# Altium schematic symbol library LATTICEPLDS_Library.SchLib: 291 symbols (part 11 of 32) (continued)
## LFE2M-100-F1152 (continued)
part B pins: A14 PT39A, A15 PT49B, A16 PT55A, A17 PT57A, B14 PT39B, B15 PT49A, B16 PT55B, B17 PT57B, C12 VCCIO0 (power), C14 PT37A, C15 PT41B, C16 VCCIO0 (power), C17 PT52A, D11 PT30A, D12 PT32A, D13 PT37B, D14 PT41A, D17 PT56B, E11 PT29A, E12 PT31A, E13 PT32B, E14 VCCIO0 (power), E15 PT46B, E16 PT47A, E17 PT52B, F11 PT29B, F12 PT30B, F13 PT38B, F15 PT42B, F16 PT47B, F17 PT56A, F18 PT64B, G12 PT31B, G13 PT40B, G14 PT42A, G15 PT46A, G16 PT50B, G17 PT59B, G19 PT64A, H12 VCCIO0 (power), H13 PT38A, H14 PT44B, H15 PT50A, H16 VCCIO0 (power), H17 PT58B, H18 PT63B, J13 PT40A, J14 PT45B, J15 PT51A, J17 PT59A, J18 PT60B, K14 PT44A, K15 PT48A, K16 PT51B, K17 PT58A, K18 PT63A, L15 PT45A, L16 PT48B, L17 PT60A, M14 VCCIO0 (power), M15 VCCIO0 (power)
part C pins: A18 PT66B, A19 PT72B, A20 PT75B, A21 PT86A, B18 PT66A, B19 PT72A, B20 PT75A, B21 PT86B, C18 PT69A, C19 VCCIO1 (power), C20 PT77B, C21 PT88B, C23 VCCIO1 (power), D18 PT68A, D20 PT78B, D21 PT88A, D22 PT98A, D23 PT98B, E18 PT65A, E19 PT69B, E20 PT77A, E21 VCCIO1 (power), E22 PT85A, E23 PT100B, F19 PT68B, F20 PT78A, F22 PT85B, F23 PT100A, F24 PT99B, G18 PT65B, G20 PT76B, G21 PT80B, G22 PT84A, G23 PT99A, H19 VCCIO1 (power), H20 PT71A, H21 PT79B, H22 PT81B, H23 VCCIO1 (power), H30 XRES, J20 PT76A, J21 PT80A, J22 PT84B, K19 PT67A, K20 PT71B, K21 PT79A, K22 PT81A, L18 PT67B, L19 PT70B, L20 PT70A, M20 VCCIO1 (power), M21 VCCIO1 (power)
part D pins: G32 VCCIO2 (power), H31 PR9B, H32 PR9A, H33 PR14B, H34 PR14A, J27 PR11B, J28 PR11A, J29 PR13A, J30 PR13B, J31 PR15A, J32 PR15B, J33 PR16A, J34 PR16B, K28 VCCIO2 (power), K29 PR17A, K30 PR17B, K32 VCCIO2 (power), K33 PR18A, K34 PR18B, L27 PR29B, L28 PR20B, L29 PR20A, L30 PR19A, L31 PR21A, L32 PR21B, L33 PR22A, L34 PR22B, M26 PR29A, M27 PR30A, M28 PR30B, M29 PR33A, M30 PR19B, M31 PR28A, M32 PR28B, M33 PR35A, M34 PR35B, N24 PR31B, N25 PR31A, N27 VCCIO2 (power), N28 PR32B, N29 PR32A, N30 PR33B, N32 VCCIO2 (power), N33 PR37A, N34 PR37B, P23 VCCIO2 (power), P24 PR34A, P27 PR41A, P28 PR41B, P29 PR40A, P30 PR40B, P31 PR39B, P32 PR39A, P33 PR43A, P34 PR43B, R23 VCCIO2 (power), R24 PR34B, R25 PR38B, R26 PR42B, R27 PR47B, R28 PR47A, R29 PR46B, R30 PR46A, R31 PR44A, R32 PR44B, R33 PR45B, R34 PR45A, T24 PR38A, T25 PR42A, T27 VCCIO2 (power), T28 PR51A, T29 PR51B, T30 PR52B, T32 VCCIO2 (power), T33 PR48B, T34 PR48A, U24 PR56B, U25 PR56A, U28 PR54B, U29 PR54A, U30 PR52A, U31 PR50B, U32 PR50A, U33 PR53B, U34 PR53A, V30 PR55B, V33 PR57B, V34 PR57A, Y32 PR55A
part E pins: AA23 VCCIO3 (power), AA24 PR71B, AA25 PR82B, AA26 PR87A, AA27 PR84A, AA28 PR74B, AA29 PR74A, AA30 PR73B, AA31 PR75B, AA32 PR75A, AA33 PR77A, AA34 PR77B, AB24 PR80B, AB25 PR88B, AB27 VCCIO3 (power), AB28 PR87B, AB29 PR78A, AB30 PR73A, AB32 VCCIO3 (power), AB33 PR79B, AB34 PR79A, AC24 PR82A, AC25 PR88A, AC27 PR92B, AC28 PR92A, AC29 PR84B, AC31 PR83A, AC32 PR83B, AC33 PR81B, AC34 PR81A, AD26 PR102A, AD29 PR91B, AD30 PR91A, AD31 PR89A, AD32 PR89B, AD33 PR86B, AD34 PR86A, AE28 VCCIO3 (power), AE29 PR95B, AE30 PR95A, AE32 VCCIO3 (power), AE33 PR90B, AE34 PR90A, AF27 RLM0_PLLCAP, AF28 PR102B, AF29 PR98B, AF30 PR96B, AF31 PR98A, AF32 PR96A, AF33 PR93B, AF34 PR93A, AG33 PR97B, AG34 PR97A, AH32 VCCIO3 (power), AH33 PR99B, AH34 PR99A, AJ32 PR101B, AJ33 PR101A, AJ34 PR100B, AK34 PR100A, U26 PR62A, U27 PR60B, V24 PR62B, V25 PR64B, V26 PR66A, V27 PR65A, V28 PR65B, V29 PR60A, V31 PR59B, V32 PR59A, W24 PR64A, W25 PR69A, W27 VCCIO3 (power), W28 PR66B, W29 PR61B, W30 PR61A, W32 VCCIO3 (power), W33 PR63B, W34 PR63A, Y23 VCCIO3 (power), Y24 PR69B, Y25 PR71A, Y26 PR80A, Y27 PR78B, Y28 PR72B, Y29 PR72A, Y30 PR70A, Y31 PR70B, Y33 PR68B, Y34 PR68A
part F pins: AC20 VCCIO4 (power), AC21 VCCIO4 (power), AD18 PB67B, AD20 PB80A, AE18 PB71B, AE20 PB82A, AF18 PB67A, AF20 PB80B, AG18 PB71A, AG19 VCCIO4 (power), AG20 PB82B, AG21 PB90B, AG22 PB90A, AG23 VCCIO4 (power), AH18 PB72B, AH19 PB78A, AH20 PB81B, AH21 PB89B, AH22 PB89A, AH23 PB99B, AJ18 PB72A, AJ19 PB81A, AJ20 PB78B, AJ22 PB97B, AJ23 PB99A, AK18 PB73A, AK19 PB73B, AK20 PB75B, AK21 VCCIO4 (power), AK22 PB97A, AK23 PB98B, AL20 PB75A, AL21 PB76B, AL22 PB92B, AL23 PB98A, AL24 PB96B, AM19 VCCIO4 (power), AM20 PB69B, AM21 PB70B, AM22 PB92A, AM24 PB96A, AN19 PB68B, AN20 PB70A, AN21 PB74B, AN22 PB76A, AN23 PB95B, AP19 PB68A, AP20 PB69A, AP21 PB74A, AP23 PB95A
part G pins: AC14 VCCIO5 (power), AC15 VCCIO5 (power), AD16 PB53B, AD17 PB58A, AE14 PB38A, AE15 PB45A, AE16 PB51B, AE17 PB58B, AF13 PB44B, AF14 PB44A, AF15 PB53A, AF17 PB62A, AG12 VCCIO5 (power), AG13 PB38B, AG14 PB45B, AG15 PB51A, AG16 VCCIO5 (power), AG17 PB61A, AH12 PB32B, AH14 PB40A, AH15 PB46A, AH16 PB54B, AH17 PB62B, AJ12 PB32A, AJ15 PB40B, AJ16 PB48B, AJ17 PB61B, AK13 PB36B, AK14 VCCIO5 (power), AK15 PB46B, AK16 PB48A, AK17 PB54A, AL13 PB36A, AL14 PB42A, AL15 PB47A, AL17 PB56A, AL18 PB59A, AM12 VCCIO5 (power), AM14 PB42B, AM15 PB47B, AM16 VCCIO5 (power), AM17 PB56B, AM18 PB59B, AM23 VCCIO4 (power), AN14 PB39A, AN15 PB49A, AN16 PB55A, AN17 PB57A, AN18 PB60B, AP14 PB39B, AP15 PB49B, AP16 PB55B, AP17 PB57B, AP18 PB60A
part H pins: AA1 PL72A, AA2 PL72B, AA3 PL75B, AA4 PL75A, AA5 PL78A, AA6 PL74A, AA7 PL74B, AA8 PL73A, AA9 PL77A, AA10 PL77B, AA12 VCCIO6 (power), AB1 PL79A, AB2 PL79B, AB3 VCCIO6 (power), AB5 PL82B, AB6 PL78B, AB7 PL82A, AB8 VCCIO6 (power), AB10 PL80B, AC1 PL81A, AC2 PL81B, AC3 PL83A, AC4 PL83B, AC5 PL86B, AC6 PL87A, AC7 PL86A, AC8 PL80A, AC9 PL84B, AC10 PL84A, AC11 PL91B, AD1 PL90B, AD2 PL90A, AD3 PL88B, AD4 PL88A, AD5 PL87B, AD6 PL92A, AD7 PL92B, AD8 PL89B, AD9 PL91A, AD10 PL89A, AE1 PL93A, AE2 PL93B, AE3 VCCIO6 (power), AE5 PL96A, AE6 PL96B, AE7 VCCIO6 (power), AE9 PL100A, AF1 PL95B, AF2 PL95A, AF3 PL97B, AF4 PL97A, AF5 PL98A, AF6 PL98B, AF7 PL100B, AG1 PL99A, AG2 PL99B, AG4 PL102B, AG5 PL102A, AG6 LLM0_PLLCAP, AH1 PL101A, AH2 PL101B, AH3 VCCIO6 (power), AJ1 PL104A, AJ2 PL104B, U1 PL59B, U2 PL59A, V1 PL63B, V2 PL63A, V3 PL62B, V4 PL62A, V5 PL60A, V6 PL60B, V7 PL61A, V8 PL61B, W1 PL65B, W2 PL65A, W3 VCCIO6 (power), W5 PL64B, W6 PL66B, W7 PL64A, W8 VCCIO6 (power), W10 PL70A, Y1 PL68A, Y2 PL68B, Y3 PL71B, Y4 PL71A, Y5 PL69B, Y6 PL66A, Y7 PL69A, Y8 PL70B, Y9 PL73B, Y12 VCCIO6 (power)
part I pins: E1 PL11A, E2 PL11B, F1 PL13A, F2 PL13B, F3 PL9B, F4 PL9A, G1 PL15B, G2 PL15A, G3 VCCIO7 (power), G5 PL20A, G6 PL20B, H1 PL19B, H2 PL19A, H3 PL22A, H4 PL22B, H5 PL18A, H6 PL14B, H7 PL12B, J1 PL23B, J2 PL23A, J3 PL25B, J4 PL25A, J5 PL26A, J6 PL18B, J7 PL16A, J8 PL14A, K1 PL24B, K2 PL24A, K3 VCCIO7 (power), K5 PL26B, K6 PL29B, K7 VCCIO7 (power), K9 PL12A, L1 PL28B, L2 PL28A, L3 PL32A, L4 PL32B, L5 PL31B, L6 PL31A, L7 PL29A, L8 PL16B, L9 PL17A, L10 PL17B, M1 PL30B, M2 PL30A, M3 PL33A, M4 PL33B, M5 PL35A, M7 PL38B, M9 PL21A, M10 PL21B, N1 PL34A, N2 PL34B, N3 VCCIO7 (power), N5 PL41B, N6 PL35B, N7 PL40A, N8 VCCIO7 (power), P1 PL39A, P2 PL39B, P3 PL37A, P4 PL37B, P5 PL41A, P6 PL42B, P7 PL40B, P8 PL42A, P9 PL38A, P11 PL44B, P12 VCCIO7 (power), R1 PL47A, R2 PL47B, R3 PL43A, R4 PL43B, R5 PL46A, R6 PL52B, R7 PL45A, R8 PL45B, R10 PL44A, R11 PL48A, R12 VCCIO7 (power), T1 PL50A, T2 PL50B, T3 VCCIO7 (power), T5 PL46B, T6 PL52A, T7 PL53B, T8 VCCIO7 (power), T10 PL48B, U3 PL57B, U4 PL57A, U5 PL54A, U6 PL54B, U7 PL55A, U8 PL51B, U9 PL53A, U10 PL51A, V9 PL55B, V10 PL56B, V11 PL56A
part J pins: AD24 CFG1, AD25 CSN, AD28 VCCIO8 (power), AE24 WRITEN, AE25 INITN, AE26 D6, AF25 PROGRAMN, AF26 D4, AG27 DI, AG28 D1, AG29 D0, AG30 D2, AG32 VCCIO8 (power), AH28 CFG2, AH29 D3, AH30 D5, AJ28 CCLK, AJ29 CFG0, AJ30 CS1N, AJ31 D7, AK31 DONE, AK32 DOUT_CSON, AK33 BUSY
part K pins: AF10 TDO, AK1 TDI, AK2 TCK, AK3 VCCJ, AL1 TMS
part L pins: A2 ULC_SQ_HDOUTP3, A3 ULC_SQ_HDOUTN3, A4 ULC_SQ_HDOUTN2, A5 ULC_SQ_HDOUTP2, A6 ULC_SQ_HDOUTP1, A7 ULC_SQ_HDOUTN1, A8 ULC_SQ_HDOUTN0, A9 ULC_SQ_HDOUTP0, B1 ULC_SQ_VCCIB3, B2 ULC_SQ_VCCRX3, B3 ULC_SQ_VCCTX3, B4 ULC_SQ_VCCTX2, B5 ULC_SQ_VCCRX2, B6 ULC_SQ_VCCRX1, B7 ULC_SQ_VCCTX1, B8 ULC_SQ_VCCTX0, B9 ULC_SQ_VCCIB0, C1 ULC_SQ_VCCOB3, C2 ULC_SQ_HDINP3, C3 ULC_SQ_HDINN3, C4 ULC_SQ_HDINN2, C5 ULC_SQ_HDINP2, C6 ULC_SQ_HDINP1, C7 ULC_SQ_HDINN1, C8 ULC_SQ_HDINN0, C9 ULC_SQ_HDINP0, D3 ULC_SQ_VCCOB2, D4 ULC_SQ_VCCIB2, D5 ULC_SQ_REFCLKP, D6 ULC_SQ_VCCP, D7 ULC_SQ_VCCRX0, D8 ULC_SQ_VCCIB1, D9 ULC_SQ_VCCOB0, E5 ULC_SQ_REFCLKN, E6 ULC_SQ_VCCAUX33, E7 ULC_SQ_VCCOB1
part M pins: A26 URC_SQ_HDOUTP3, A27 URC_SQ_HDOUTN3, A28 URC_SQ_HDOUTN2, A29 URC_SQ_HDOUTP2, A30 URC_SQ_HDOUTP1, A31 URC_SQ_HDOUTN1, A32 URC_SQ_HDOUTN0, A33 URC_SQ_HDOUTP0, B26 URC_SQ_VCCIB3, B27 URC_SQ_VCCTX3, B28 URC_SQ_VCCTX2, B29 URC_SQ_VCCRX2, B30 URC_SQ_VCCRX1, B31 URC_SQ_VCCTX1, B32 URC_SQ_VCCTX0, B33 URC_SQ_VCCRX0, B34 URC_SQ_VCCIB0, C26 URC_SQ_HDINP3, C27 URC_SQ_HDINN3, C28 URC_SQ_HDINN2, C29 URC_SQ_HDINP2, C30 URC_SQ_HDINP1, C31 URC_SQ_HDINN1, C32 URC_SQ_HDINN0, C33 URC_SQ_HDINP0, C34 URC_SQ_VCCOB0, D26 URC_SQ_VCCOB3, D27 URC_SQ_VCCIB2, D28 URC_SQ_VCCRX3, D29 URC_SQ_VCCP, D30 URC_SQ_REFCLKP, D31 URC_SQ_VCCIB1, D32 URC_SQ_VCCOB1, E28 URC_SQ_VCCOB2, E29 URC_SQ_VCCAUX33, E30 URC_SQ_REFCLKN
part N pins: AK28 LRC_SQ_VCCOB2, AK29 LRC_SQ_VCCAUX33, AK30 LRC_SQ_REFCLKN, AL26 LRC_SQ_VCCOB3, AL27 LRC_SQ_VCCIB2, AL28 LRC_SQ_VCCRX3, AL29 LRC_SQ_VCCP, AL30 LRC_SQ_REFCLKP, AL31 LRC_SQ_VCCIB1, AL32 LRC_SQ_VCCOB1, AM26 LRC_SQ_HDINP3, AM27 LRC_SQ_HDINN3, AM28 LRC_SQ_HDINN2, AM29 LRC_SQ_HDINP2, AM30 LRC_SQ_HDINP1, AM31 LRC_SQ_HDINN1, AM32 LRC_SQ_HDINN0, AM33 LRC_SQ_HDINP0, AM34 LRC_SQ_VCCOB0, AN26 LRC_SQ_VCCIB3, AN27 LRC_SQ_VCCTX3, AN28 LRC_SQ_VCCTX2, AN29 LRC_SQ_VCCRX2, AN30 LRC_SQ_VCCRX1, AN31 LRC_SQ_VCCTX1, AN32 LRC_SQ_VCCTX0, AN33 LRC_SQ_VCCRX0, AN34 LRC_SQ_VCCIB0, AP26 LRC_SQ_HDOUTP3, AP27 LRC_SQ_HDOUTN3, AP28 LRC_SQ_HDOUTN2, AP29 LRC_SQ_HDOUTP2, AP30 LRC_SQ_HDOUTP1, AP31 LRC_SQ_HDOUTN1, AP32 LRC_SQ_HDOUTN0, AP33 LRC_SQ_HDOUTP0
part O pins: AK5 LLC_SQ_REFCLKN, AK6 LLC_SQ_VCCAUX33, AK7 LLC_SQ_VCCOB1, AL3 LLC_SQ_VCCOB2, AL4 LLC_SQ_VCCIB2, AL5 LLC_SQ_REFCLKP, AL6 LLC_SQ_VCCP, AL7 LLC_SQ_VCCRX0, AL8 LLC_SQ_VCCIB1, AL9 LLC_SQ_VCCOB0, AM1 LLC_SQ_VCCOB3, AM2 LLC_SQ_HDINP3, AM3 LLC_SQ_HDINN3, AM4 LLC_SQ_HDINN2, AM5 LLC_SQ_HDINP2, AM6 LLC_SQ_HDINP1, AM7 LLC_SQ_HDINN1, AM8 LLC_SQ_HDINN0, AM9 LLC_SQ_HDINP0, AN1 LLC_SQ_VCCIB3, AN2 LLC_SQ_VCCRX3, AN3 LLC_SQ_VCCTX3, AN4 LLC_SQ_VCCTX2, AN5 LLC_SQ_VCCRX2, AN6 LLC_SQ_VCCRX1, AN7 LLC_SQ_VCCTX1, AN8 LLC_SQ_VCCTX0, AN9 LLC_SQ_VCCIB0, AP2 LLC_SQ_HDOUTP3, AP3 LLC_SQ_HDOUTN3, AP4 LLC_SQ_HDOUTN2, AP5 LLC_SQ_HDOUTP2, AP6 LLC_SQ_HDOUTP1, AP7 LLC_SQ_HDOUTN1, AP8 LLC_SQ_HDOUTN0, AP9 LLC_SQ_HDOUTP0
part P pins: A11 NC, A12 NC, A23 NC, A24 NC, AA11 NC, AB11 NC, AC26 NC, AC30 NC, AD11 NC, AD12 NC, AD13 NC, AD14 NC, AD15 NC, AD19 NC, AD21 NC, AD22 NC, AD23 NC, AE10 NC, AE11 NC, AE12 NC, AE13 NC, AE19 NC, AE21 NC, AE22 NC, AE23 NC, AF8 NC, AF9 NC, AF11 NC, AF21 NC, AF22 NC, AF24 NC, AG3 NC, AG7 NC, AG8 NC, AG9 NC, AG10 NC, AG11 NC, AG24 NC, AG25 NC, AG26 NC, AH5 NC, AH6 NC, AH7 NC, AH8 NC, AH9 NC, AH10 NC, AH11 NC, AH13 NC, AH24 NC, AH25 NC, AH26 NC, AH27 NC, AJ3 NC, AJ4 NC, AJ5 NC, AJ6 NC, AJ7 NC, AJ8 NC, AJ9 NC, AJ10 NC, AJ11 NC, AJ13 NC, AJ24 NC, AJ25 NC, AJ26 NC, AJ27 NC, AK4 NC, AK9 NC, AK10 NC, AK11 NC, AK12 NC, AK24 NC, AK25 NC, AK26 NC, AL11 NC, AL12 NC, AL34 NC, AM10 NC, AM11 NC, AM13 NC, AM25 NC, AN10 NC, AN11 NC, AN12 NC, AN13 NC, AN24 NC, AN25 NC, AP11 NC, AP12 NC, AP24 NC, B10 NC, B11 NC, B12 NC, B13 NC, B22 NC, B23 NC, B24 NC, B25 NC, C10 NC, C11 NC, C13 NC, C22 NC, C24 NC, C25 NC, D1 NC, D15 NC, D24 NC, D34 NC, E3 NC, E4 NC, E9 NC, E10 NC, E24 NC, E25 NC, E26 NC, E31 NC, E32 NC, E33 NC, E34 NC, F5 NC, F6 NC, F7 NC, F8 NC, F9 NC, F10 NC, F25 NC, F26 NC, F27 NC, F28 NC, F29 NC, F30 NC, F31 NC, F32 NC, F33 NC, F34 NC, G7 NC, G8 NC, G9 NC, G10 NC, G11 NC, G24 NC, G25 NC, G26 NC, G27 NC, G28 NC, G29 NC, G30 NC, G33 NC, G34 NC, H8 NC, H9 NC, H10 NC, H11 NC, H24 NC, H25 NC, H26 NC, H27 NC, H28 NC, H29 NC, J9 NC, J10 NC, J11 NC, J24 NC, J25 NC, J26 NC, K10 NC, K11 NC, K12 NC, K13 NC, K23 NC, K24 NC, K25 NC, K26 NC, L11 NC, L12 NC, L13 NC, L14 NC, L21 NC, L22 NC, L23 NC, L24 NC, L25 NC, L26 NC, M6 NC, M8 NC, M11 NC, M24 NC, M25 NC, N10 NC, N11 NC, P10 NC, P25 NC, P26 NC, R9 NC, T11 NC, U11 NC, W11 NC, Y10 NC, Y11 NC
part A text: SUPPLIES
part B text: BANK 0
part C text: BANK 1
part D text: BANK 2
part E text: BANK 3
part F text: BANK 4
part G text: BANK 5
part H text: BANK 6
part I text: BANK 7
part J text: BANK 8
part L text: SERDES
part M text: SERDES
part N text: SERDES
part O text: SERDES

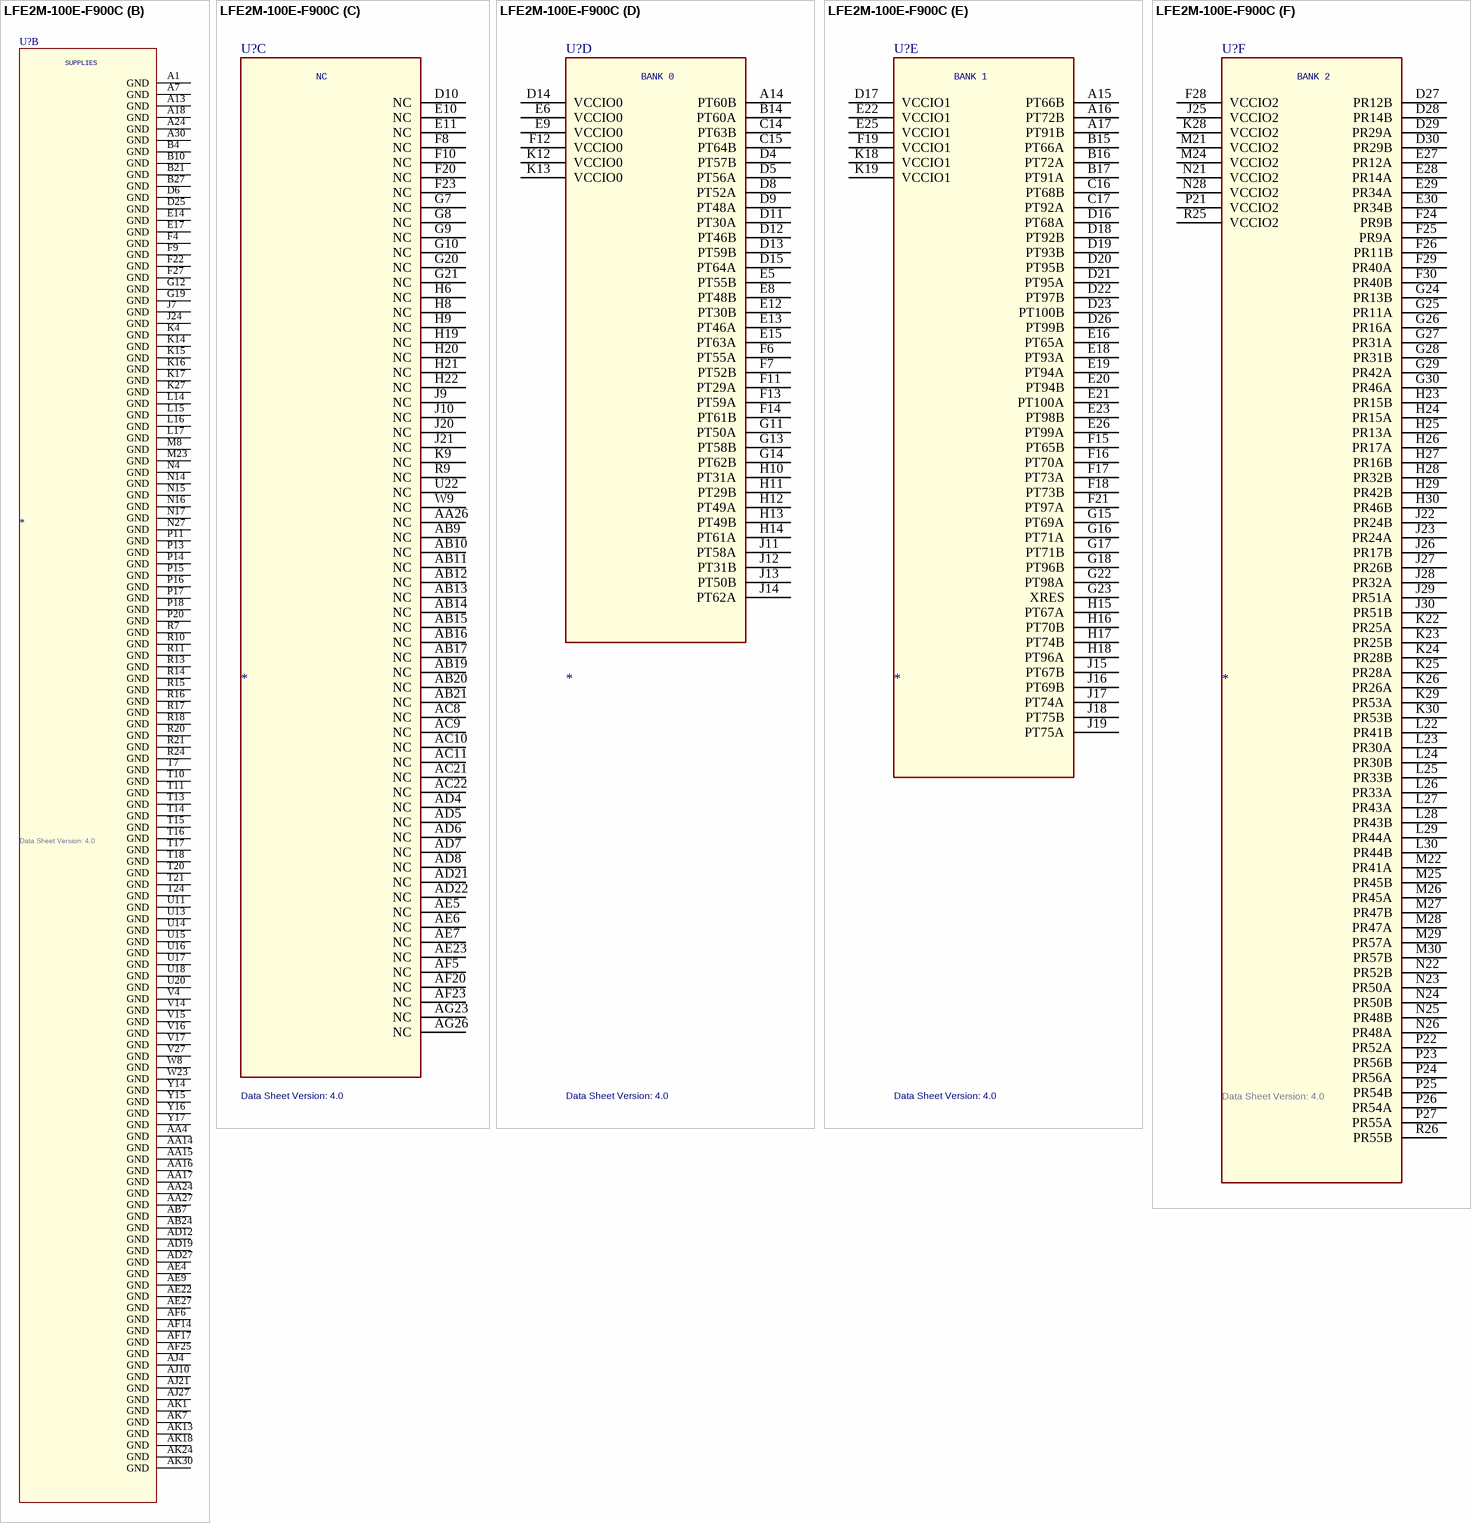
[diagram p120: symbol LFE2M-100E-F900C]

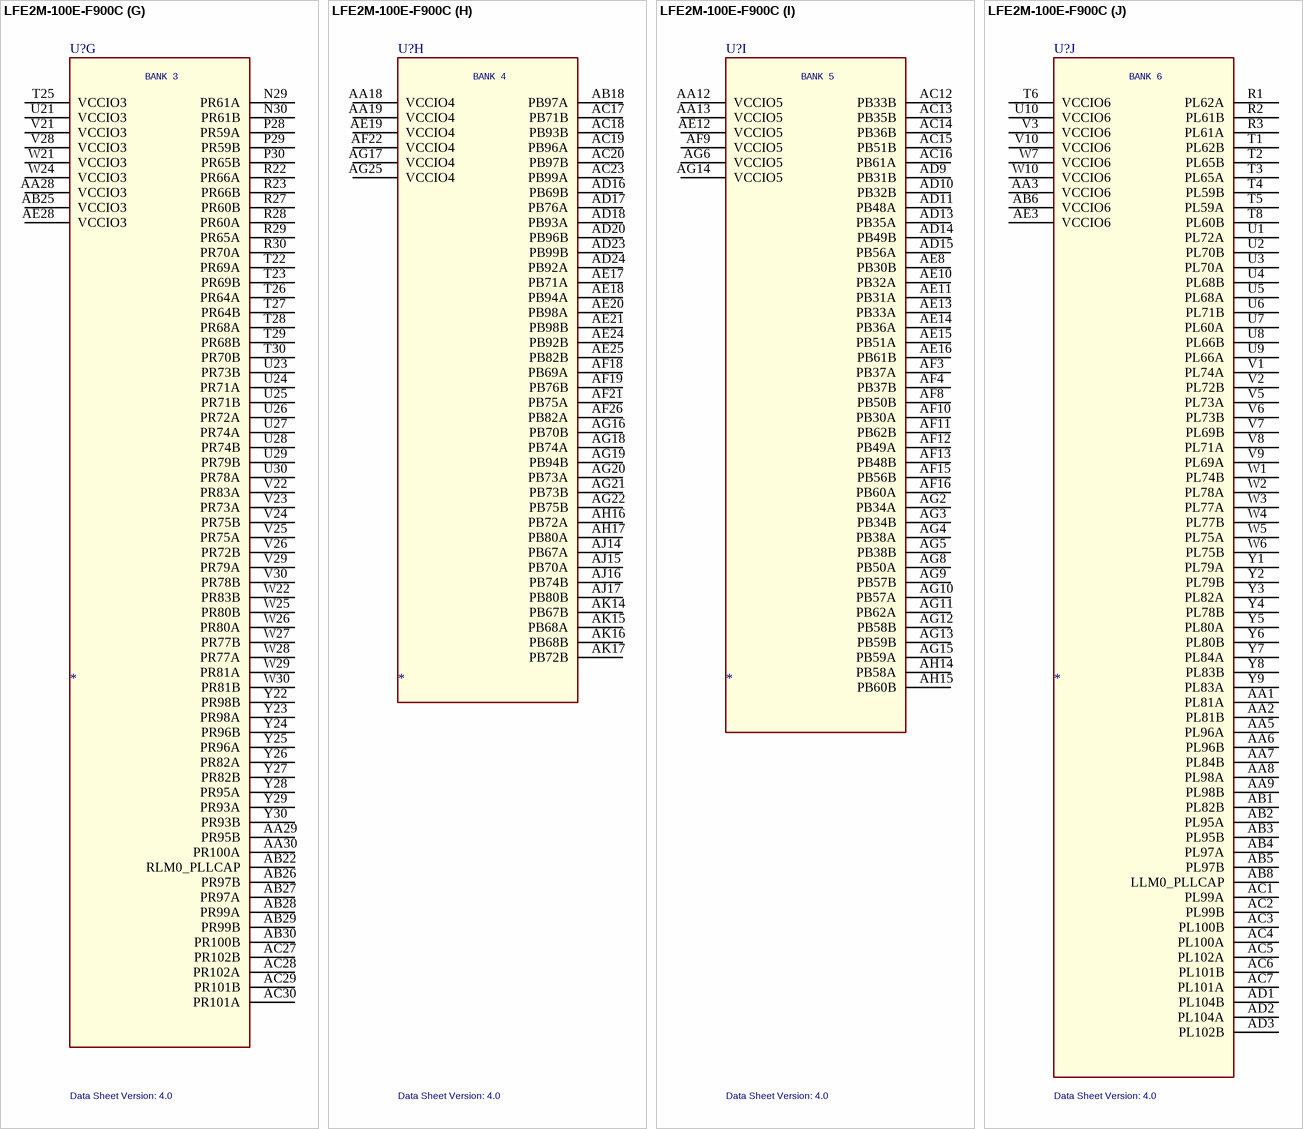
[diagram p121: symbol LFE2M-100E-F900C]

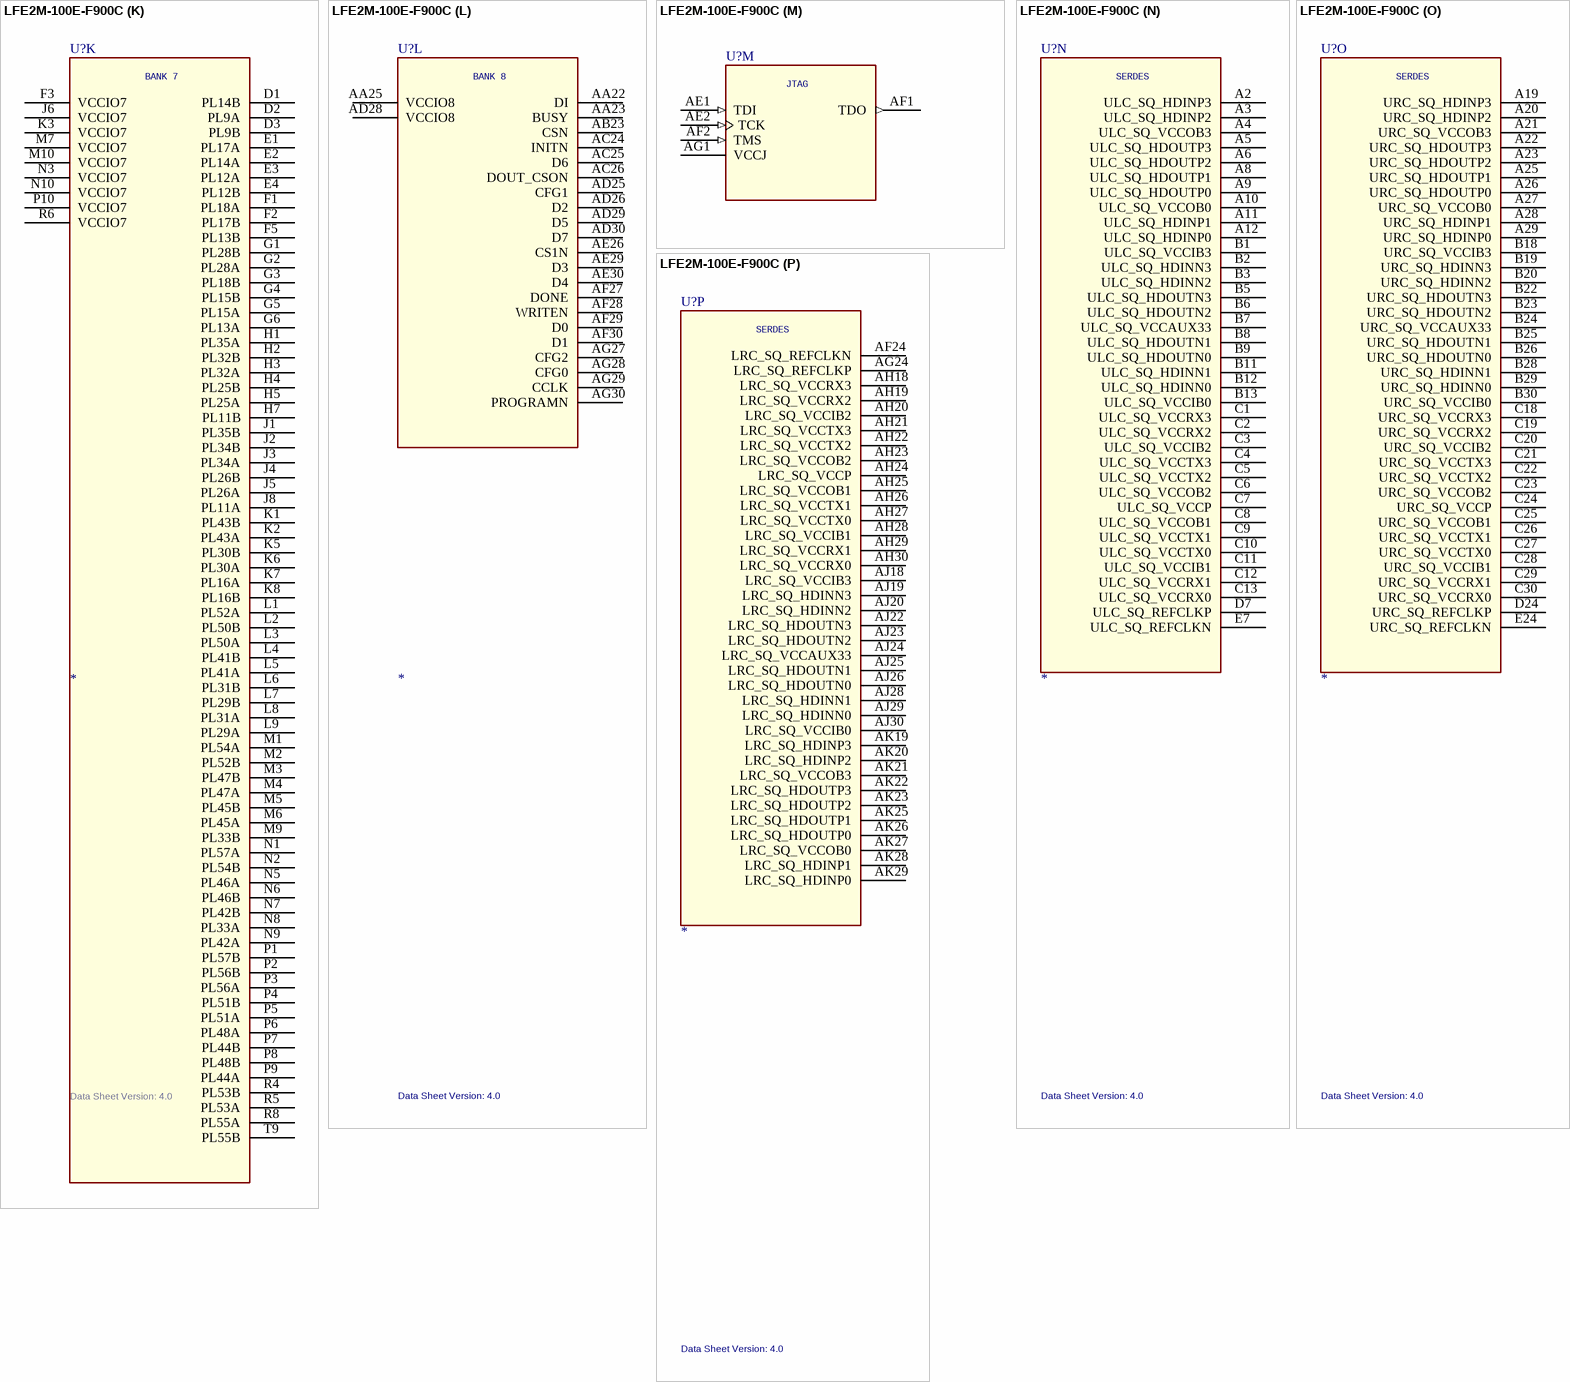
[diagram p122: symbol LFE2M-100E-F900C]

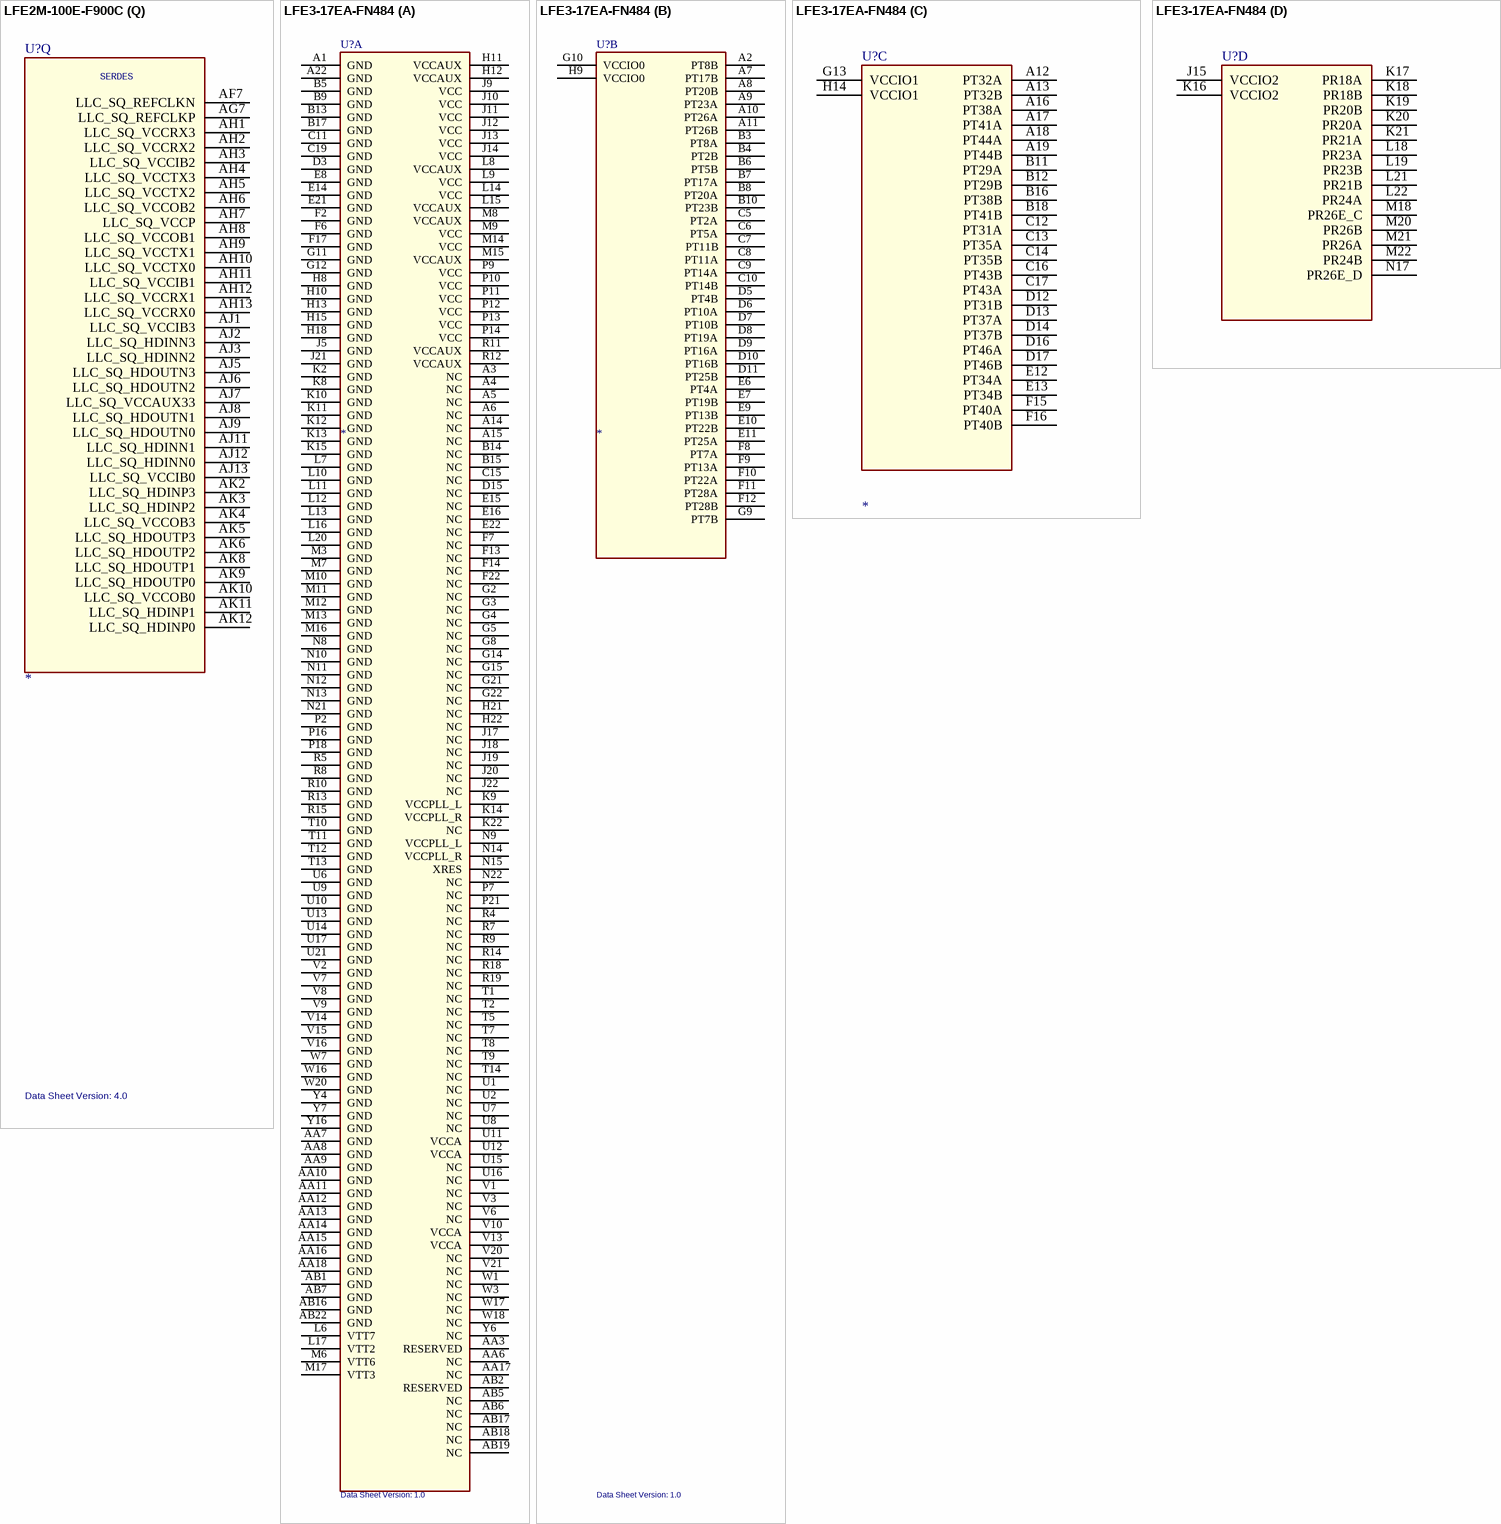
[diagram p123: symbols LFE2M-100E-F900C to LFE3-17EA-FN484]